# Altium footprint library rescap.PcbLib: 82 footprints (part 6 of 6)
Each footprint in its own frame and in the unit in brackets; x right, y up, seen from the top. Pads: shape width x height; smd on the part's side, far side on the other; paste and mask are expansions set on the pad; w line width, h text height; cw(c..) or ccw(c..) is an arc to the next point about the centre after c.
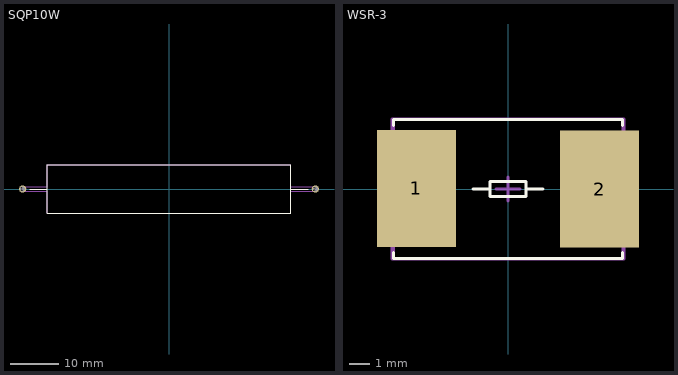
[diagram p5: the footprints below, top view; thin cyan lines are the x and y axes]

## SQP10W [mm]
height 10
pads (2):
  round 1.5 hole 1: 1(-30,0) 2(30,0)
Top Overlay:
  lines w0.15: -28.5,0 -25,0 ; 25,0 28.5,0 ; -25,-5 -25,5 25,5 25,-5 -25,-5
Top Courtyard:
  lines w0.15: -30,-0.5 -30,0.5 -25,0.5 -25,5 0,5 25,5 25,0.5 30,0.5 30,-0.5 25,-0.5 25,-5 0,-5 -25,-5 -25,-0.5 -30,-0.5
3D body "[res] SQP 10W.stp": height 10, standoff -4, extent -30.349,-5 30.349,5

## WSR-3 [mm]
height 2.4
pads (2):
  rect 3.94x5.84 smd: 1(-4.575,0.025) 2(4.575,0)
Top Overlay:
  lines w0.15: -5.73,-3.175 -5.73,-3.475 5.725,-3.475 5.725,-3.175 ; -5.73,3.175 -5.73,3.475 5.725,3.475 5.725,3.175 ; -1.75,0 -0.9,0 ; 1.75,0 0.9,0 ; -0.9,0 -0.9,-0.375 0,-0.375 0.9,-0.375 0.9,0 ; -0.9,0 -0.9,0.375 0,0.375 0.9,0.375 0.9,0
Top Courtyard:
  lines w0.15: -0.6,0 0,0 ; 0,-0.6 0,0 ; 0,0.6 0,0 ; 0.6,0 0,0 ; -5.8,-3.5 5.8,-3.5 5.8,3.5 -5.8,3.5 -5.8,-3.5
Mechanical 29:
  lines w0.15: -5.725,-3.475 5.75,-3.475 5.75,3.475 -5.725,3.475 -5.725,-3.475
  text ".Designator" at -2.9,-0.2 h1
3D body "WSR-3.STEP": height 2.43, standoff 0, extent -5.785,-3.465 5.775,3.515